# Altium footprint library Dahlia Carrier Board.PcbLib: 99 footprints (part 7 of 7)
Each footprint in its own frame and in the unit in brackets; x right, y up, seen from the top. Pads: shape width x height; smd on the part's side, far side on the other; paste and mask are expansions set on the pad; w line width, h text height; cw(c..) or ccw(c..) is an arc to the next point about the centre after c.
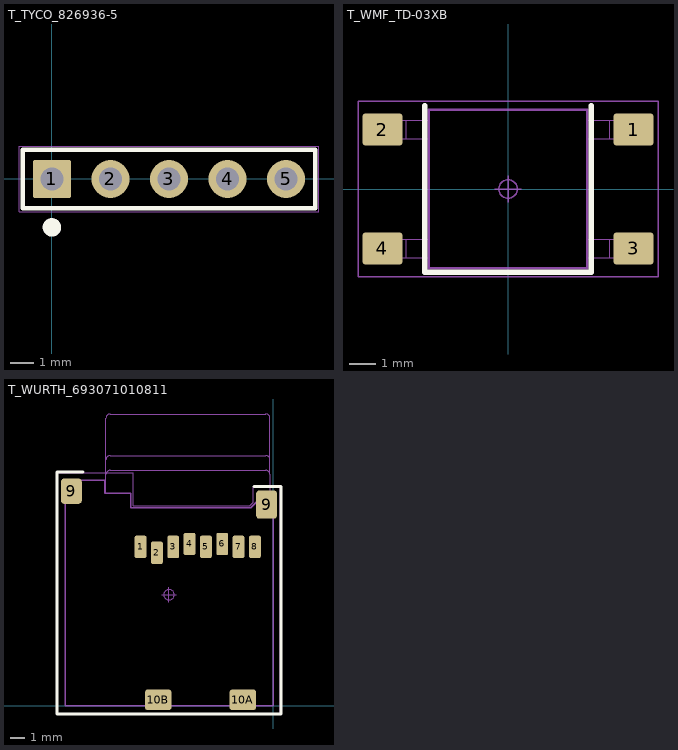
[diagram p6: the footprints below, top view; thin cyan lines are the x and y axes]

## T_TYCO_826936-5 [mm]
height 5.5
pads (5):
  rrect10% 1.65x1.65 hole 1: 1(0,0)
  round 1.65 hole 1: 2(2.54,0) 3(5.08,0) 4(7.62,0) 5(10.16,0)
Top Overlay:
  circle w0.4: c0,-2.1 r0.2
  lines w0.2: -1.27,-1.27 -1.27,1.27 11.43,1.27 11.43,-1.27 -1.27,-1.27
Top Component Outline:
  lines w0.05: -1.43,-1.43 -1.43,1.43 11.59,1.43 11.59,-1.43 -1.43,-1.43
Top 3D Body:
  lines w0.001: 11.43,-1.275 -1.27,-1.275 -1.27,1.27 11.43,1.27 11.43,-1.27
Top Dimensions:
  lines w0.1: 11.425,-1.27 -1.27,-1.27 -1.27,1.27 11.425,1.27 ; 11.43,-1.27 11.43,1.27
Top Component Center:
  circle w0.05: c0,0 r0.35
  lines w0.05: -0.5,0 0.5,0 ; 0,-0.5 0,0.5
Top Assembly:
  text ".Designator" at 4.73,-0.265 h0.75
3D body "TSW-105-07-G-S_sc.stp": height 8.38, standoff -2.54, extent -1.397,-1.27 11.43,1.27

## T_WMF_TD-03XB [mm]
height 13.83
pads (4):
  rrect15% 1.5x1.2 smd: 1(4.75,2.25) 2(-4.75,2.25) 3(4.75,-2.25) 4(-4.75,-2.25)
Top Overlay:
  lines w0.2: -3.15,3.15 -3.15,-3.15 3.15,-3.15 3.15,3.15
Top Component Outline:
  lines w0.05: -5.675,-3.321 -5.675,3.321 5.675,3.321 5.675,-3.321 -5.675,-3.321
Top 3D Body:
  lines w0.001: -4.05,-2.6 -4.05,-1.9 ; -4.05,1.9 -4.05,2.6 ; -3.85,-2.6 -3.85,-1.9 ; -3.85,1.9 -3.85,2.6 ; -3,-2.6 -5.15,-2.6 -5.15,-1.9 -3,-1.9 ; -3,1.9 -5.15,1.9 -5.15,2.6 -3,2.6 ; 3,-2.6 5.15,-2.6 5.15,-1.9 3,-1.9 ; 3,1.9 5.15,1.9 5.15,2.6 3,2.6 ; 3.85,-2.6 3.85,-1.9 ; 3.85,1.9 3.85,2.6 ; 4.05,-2.6 4.05,-1.9 ; 4.05,1.9 4.05,2.6 ; -3,-3 -3,3 3,3 3,-3 -3,-3
Top Dimensions:
  lines w0.1: -3,-3 -3,3 3,3 3,-3 -3,-3
Top Component Center:
  circle w0.05: c0,0 r0.35
  lines w0.05: -0.5,0 0.5,0 ; 0,-0.5 0,0.5
Top Assembly:
  text ".Designator" at -0.675,-0.625 h0.75
3D body: height 1, standoff 0.8, extent 3,1.9 3.85,2.6
3D body: height 1, standoff 0.8, extent 3,-2.6 3.85,-1.9
3D body: height 1, standoff 0.8, extent -3.85,-2.6 -3,-1.9
3D body: height 1, standoff 0.8, extent -3.85,1.9 -3,2.6
3D body: height 1, standoff 0, extent -4.05,1.9 -3.85,2.6
3D body: height 1, standoff 0, extent -4.05,-2.6 -3.85,-1.9
3D body: height 1, standoff 0, extent 3.85,-2.6 4.05,-1.9
3D body: height 1, standoff 0, extent 3.85,1.9 4.05,2.6
3D body: height 0.2, standoff 0, extent 4.05,1.9 5.15,2.6
3D body: height 0.2, standoff 0, extent 4.05,-2.6 5.15,-1.9
3D body: height 0.2, standoff 0, extent -5.15,-2.6 -4.05,-1.9
3D body: height 0.2, standoff 0, extent -5.15,1.9 -4.05,2.6
3D body: height 3.7, standoff 3.5, extent 1.754,-2.749 2.75,-1.751
3D body: height 3.7, standoff 3.5, extent -2.746,-2.749 -1.75,-1.751
3D body: height 3.7, standoff 3.5, extent -2.746,1.751 -1.75,2.749
3D body: height 3.7, standoff 3.5, extent 1.754,1.751 2.75,2.749
3D body: height 3.49, standoff 0, extent -3,-3 3,3
3D body: height 7.8, standoff 3.5, extent -1.736,-1.747 1.75,1.747
3D body: height 3.5, standoff 3.49, extent -3,-3 3,3

## T_WURTH_693071010811 [mm] "MicroSD Holder, Push-Pust Type,"
height 1.98
pads (12):
  rrect30% 0.8x1.5 smd: 1(-8.94,10.7) 2(-7.84,10.3) 3(-6.74,10.7) 4(-5.64,10.9) 5(-4.54,10.7) 6(-3.44,10.9) 7(-2.34,10.7) 8(-1.24,10.7)
  rrect30% 1.4x1.7 smd: 9(-13.6,14.45)
  rrect30% 1.4x1.9 smd: 9(-0.45,13.55)
  rrect30% 1.8x1.4 smd: 10A(-2.05,0.4) 10B(-7.75,0.4)
Top Overlay:
  lines w0.2: -12.802,15.748 -14.554,15.748 -14.554,-0.559 0.508,-0.559 0.508,14.757 -1.295,14.757
Top Component Outline:
  lines w0.05: -14.503,-0.508 0.457,-0.508 0.457,14.707 -1.346,14.707 -1.346,13.691 -1.575,13.462 -9.423,13.462 -9.423,15.697 -14.503,15.697 -14.503,-0.508
Top 3D Body:
  lines w0.01: -11.27,14.326 -11.27,15.575 ; -11.27,16.575 cw(c-10.995,16.575) -10.995,16.85 -0.495,16.85 cw(c-0.495,16.575) -0.22,16.575 ; -0.22,14.2 -0.22,15.575 ccw(c-0.495,15.575) -0.495,15.85 -10.995,15.85 ccw(c-10.995,15.575) -11.27,15.575 ; -0.22,15.578 -0.22,19.375 ccw(c-0.495,19.375) -0.495,19.65 -10.995,19.65 ccw(c-10.995,19.375) -11.27,19.375 -11.27,15.575 ; -14,0 0,0 0,14.2 -0.659,14.2 -1.524,13.335 -9.601,13.335 -9.601,14.326 -11.354,14.326 -11.354,15.2 -14,15.2 -14,0
Top Dimensions:
  lines w0.1: -14,0 0,0 0,14.2 -0.659,14.2 -1.524,13.335 -9.601,13.335 -9.601,14.326 -11.354,14.326 -11.354,15.2 -14,15.2 -14,0
Top Component Center:
  circle w0.05: c-7.025,7.474 r0.35
  lines w0.05: -7.525,7.474 -6.525,7.474 ; -7.025,6.974 -7.025,7.974
Top Assembly:
  text ".Designator" at -14.554,-1.27 h0.75
3D body "User Library-Micro SD Card.step": height 1.8, standoff 0.69, extent -11.269,4.623 -0.22,19.65
3D body "693071010811.stp": height 1.83, standoff -0.07, extent -14,0 0,15.2